# Altium footprint library Cty1.PcbLib: 1378 footprints (part 9 of 87)
Each footprint in its own frame and in the unit in brackets; x right, y up, seen from the top. Pads: shape width x height; smd on the part's side, far side on the other; paste and mask are expansions set on the pad; w line width, h text height; cw(c..) or ccw(c..) is an arc to the next point about the centre after c.
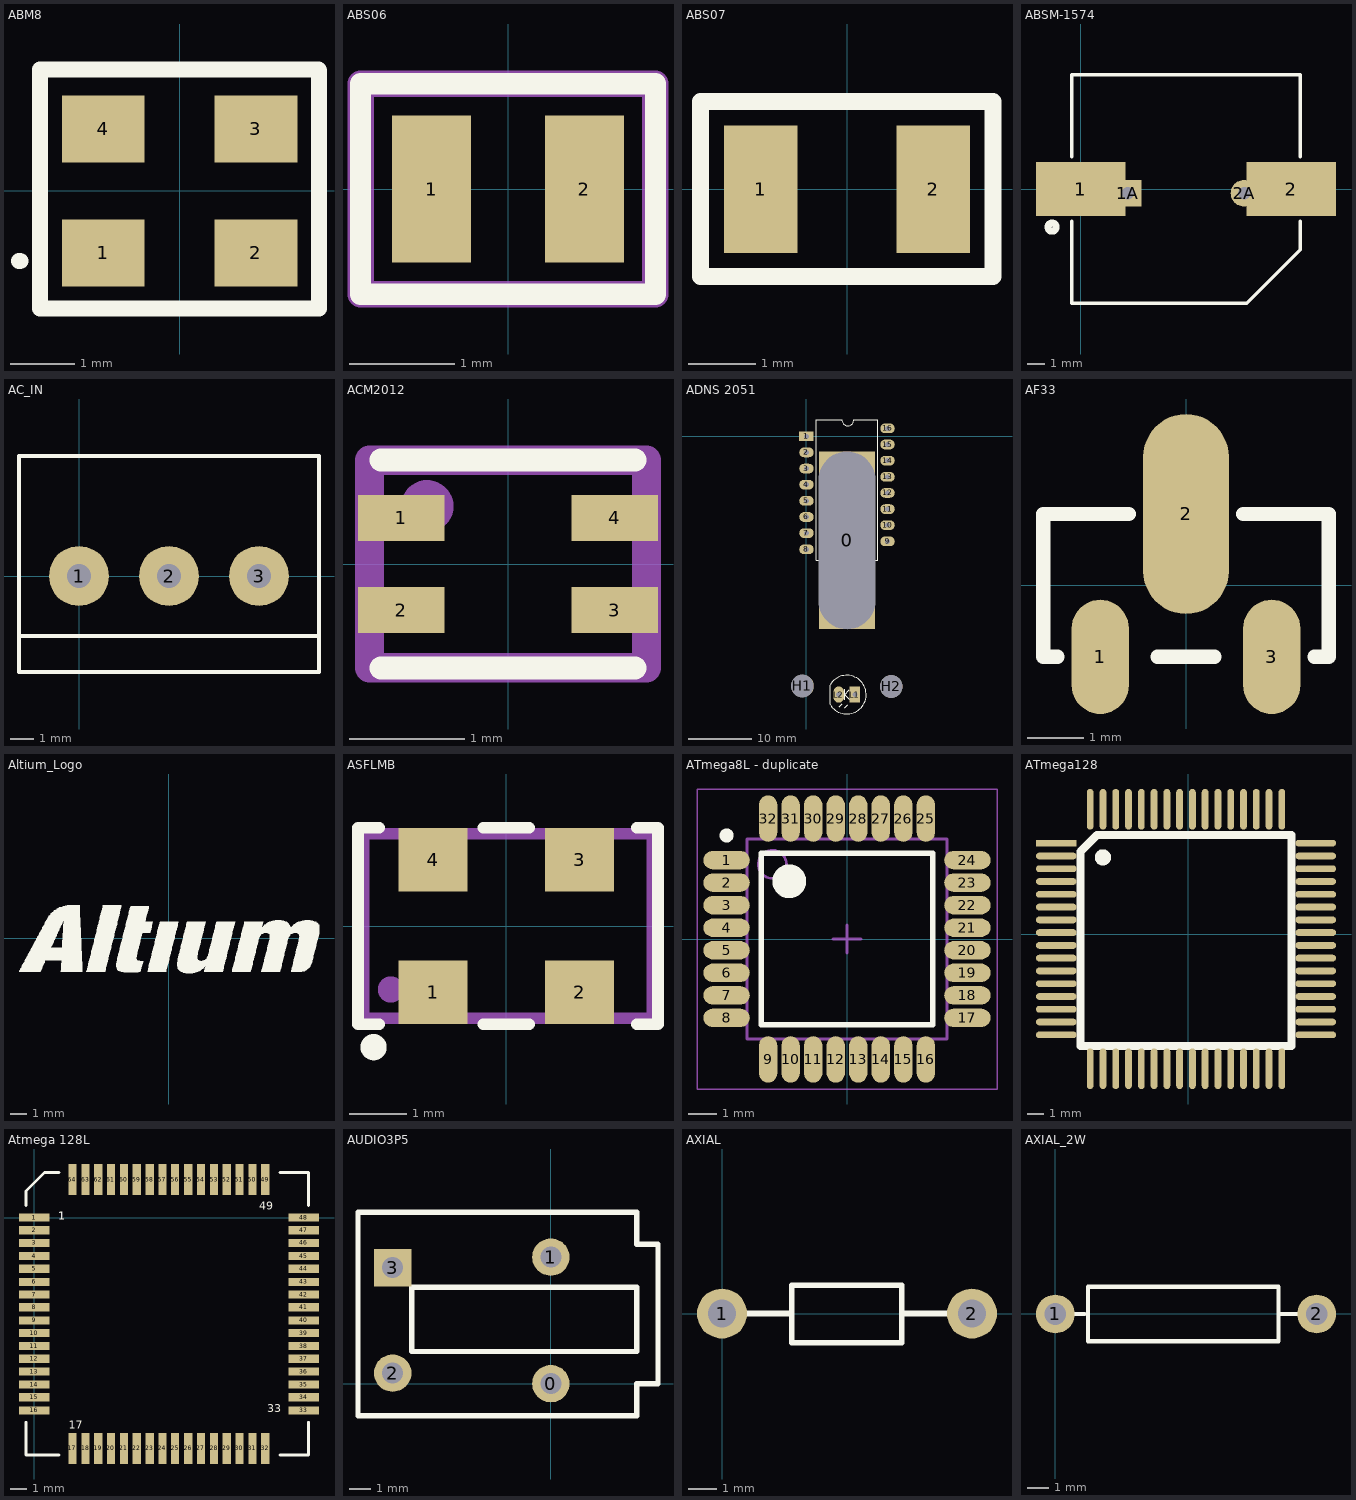
[diagram p8: the footprints below, top view; thin cyan lines are the x and y axes]

## ABM8 [mm] "HC-49US XTAL"
height 4.3
pads (4):
  rect 1.3x1.05 smd: 1(-1.2,-0.97) 2(1.19,-0.97) 3(1.19,0.97) 4(-1.2,0.97)
Top Overlay:
  lines w0.254: -2.52,-1.1 -2.5,-1.1 ; 1.25,1.9 2.17,1.9 2.18,1.89 2.18,-1.84 -2.19,-1.84 -2.19,1.9 2.1,1.9
3D body "ABM8.STEP": height 0.82, standoff 0.02, extent -1.587,-1.346 1.613,1.143

## ABS06 [mm]
pads (2):
  rect 0.75x1.4 smd: 1(-0.725,0) 2(0.725,0)
Top Overlay:
  lines w0.2: -1.4,-1 -1.4,0 -1.4,1 1.4,1 1.4,-1 -1.4,-1
Mechanical 16:
  lines w0.254: -1.4,-1 1.4,-1 1.4,1 -1.4,1 -1.4,-1
Mechanical 29:
  text ".Designator" at -0.5,-0.3 h0.6
3D body "ABS06.STEP": height 0.6, standoff 0, extent -1,-0.62 1,0.6
3D body: height 0.61, standoff 0.5, extent -0.825,-0.36 0.825,0.34

## ABS07 [mm] "HC-49US XTAL"
height 4.3
pads (2):
  rect 1.1x1.9 smd: 1(-1.29,0) 2(1.29,0)
Top Overlay:
  lines w0.254: -2.19,-1.3 2.18,-1.3 2.18,1.31 -2.19,1.31 -2.19,-1.3
3D body "ABS07.STEP": height 0.9, standoff 0.02, extent -1.6,-0.749 1.6,0.749

## ABSM-1574 [mm]
pads (4):
  rect 5x3 smd: 1(0,0) 2(11.8,0)
  rect 1.5x1.5 hole 0.7: 1A(2.65,-0.24)
  round 1.5 hole 0.7: 2A(9.15,-0.24)
Top Overlay:
  circle w0.4: c-1.6,-2.134 r0.227
  lines w0.2: -0.5,-1.8 -0.5,-6.4 9.3,-6.4 12.3,-3.4 12.3,-1.8 ; -0.5,1.8 -0.5,6.4 12.3,6.4 12.3,1.8

## AC_IN [mil] "AC_Input"
height 3
pads (3):
  round 100 hole 40 square: 1(0,0) 2(150,0) 3(300,0)
Top Overlay:
  lines w7: -100,-100 400,-100 ; -100,-160 -100,200 400,200 400,-160 -100,-160

## ACM2012 [mm]
pads (4):
  rect 0.75x0.4 smd mask+0.076: 1(-0.925,0.4) 2(-0.925,-0.4) 3(0.925,-0.4) 4(0.925,0.4)
Top Overlay:
  lines w0.2: -1.1,-0.9 1.1,-0.9 ; -1.1,0.9 1.1,0.9
Mechanical 16:
  circle w0.254: c-0.7,0.5 r0.1
  lines w0.254: -1.2,-0.9 -1.2,0.9 1.2,0.9 1.2,-0.9 -1.2,-0.9
Mechanical 29:
  text ".Designator" at 0.3,0.1 h0.4
3D body: height 1.3, standoff 0, extent -1.2,-0.7 1.2,0.7

## ADNS 2051 [mil] "Foots pin for Mouse"
pads (21):
  rect 350x1100 hole 350 slot 1100 at 90 deg: 0(251,-645)
  rect 90x60 hole 31: 1(0,0)
  oval 90x60 hole 31: 2(0,-100) 3(0,-200) 4(0,-300) 5(0,-400) 6(0,-500) 7(0,-600) 8(0,-700) 9(502,-651) 10(502,-551) 11(502,-451) 12(502,-351) 13(502,-251) 14(502,-151) 15(502,-51) 16(502,49)
  round 140 hole 140: H1(-25,-1547) H2(525,-1550)
  rect 65x100 hole 32: L1(300,-1600.5)
  oval 65x100 hole 32: L2(200,-1600.5)
Top Overlay:
  lines w7: 146,-1660.5 146,-1541.5 ; 146.06,-1540.53 cw(c250,-1600.5) 146.49,-1661.21 ; 204,-1675.5 221,-1658.5 ; 218,103 59,103 59,-767 443,-767 443,103 296,103 ; 218.97,101 ccw(c255.99,101) 293,101 ; 236,-1632.5 236,-1566.5 ; 238,-1681.5 255,-1664.5 ; 265,-1629.5 236,-1600.5 265,-1571.5 ; 394.94,-516.95 ccw(c252.8,-525.96) 395,-518
  text "ADNS2051" at 108,-229 h40

## AF33 [mil]
pads (3):
  oval 40x80 smd: 1(-60,-50) 3(60,-50)
  oval 60x140 smd: 2(0,50)
Top Overlay:
  lines w10: -90,-50 -100,-50 -100,50 -60,50 -40,50 ; -20,-50 20,-50 ; 40,50 100,50 100,-50 90,-50

## Altium_Logo [mm] "Altium Logo"
height 12.3
Top Overlay:
  drawing of 1243 lines, arcs and shapes, not listed

## ASFLMB [mm] "Creator MM"
height 0.9
pads (4):
  rect 1.2x1.1 smd: 1(-1.27,-1.15) 2(1.27,-1.15) 3(1.27,1.15) 4(-1.27,1.15)
Top Overlay:
  circle w0.254: c-2.3,-2.1 r0.1
  lines w0.2: -2.2,-1.7 -2.57,-1.7 -2.57,1.7 -2.2,1.7 ; -0.4,-1.7 0.4,-1.7 ; -0.4,1.7 0.4,1.7 ; 2.26,-1.7 2.63,-1.7 2.63,1.7 2.26,1.7
Mechanical 16:
  circle w0.254: c-2,-1.1 r0.1
  lines w0.2: -2.47,-1.6 2.53,-1.6 2.53,1.6 -2.47,1.6 -2.47,-1.6
Mechanical 29:
  text ".Designator" at 0.3,-0.5 h0.8
3D body: height 0.9, standoff 0, extent -2.47,-1.6 2.53,1.6

## ATmega8L - duplicate [mm] "TQFP, 32-Leads, Body 7.10x7.10mm, Pitch 0.80mm, IPC Medium Density"
height 1.2
pads (32):
  oval 1.65x0.65 smd: 1(-4.275,2.8) 2(-4.275,2) 3(-4.275,1.2) 4(-4.275,0.4) 5(-4.275,-0.4) 6(-4.275,-1.2) 7(-4.275,-2) 8(-4.275,-2.8) 17(4.275,-2.8) 18(4.275,-2) 19(4.275,-1.2) 20(4.275,-0.4) 21(4.275,0.4) 22(4.275,1.2) 23(4.275,2) 24(4.275,2.8)
  oval 0.65x1.65 smd: 9(-2.8,-4.275) 10(-2,-4.275) 11(-1.2,-4.275) 12(-0.4,-4.275) 13(0.4,-4.275) 14(1.2,-4.275) 15(2,-4.275) 16(2.8,-4.275) 25(2.8,4.275) 26(2,4.275) 27(1.2,4.275) 28(0.4,4.275) 29(-0.4,4.275) 30(-1.2,4.275) 31(-2,4.275) 32(-2.8,4.275)
Top Overlay:
  circle w0.25: c-4.275,3.675 r0.125
  circle w0.6: c-2.05,2.05 r0.3
  lines w0.2: -3.05,-3.05 -3.05,3.05 3.05,3.05 3.05,-3.05 -3.05,-3.05
Mechanical 13:
  circle w0.1: c-2.65,2.65 r0.5
  lines w0.1: -3.55,-3.55 -3.55,3.55 3.55,3.55 3.55,-3.55 -3.55,-3.55
Mechanical 15:
  lines w0.05: -5.325,-5.325 -5.325,5.325 5.325,5.325 5.325,-5.325 -5.325,-5.325
  lines w0.1: -0.5,0 0.5,0 ; 0,-0.5 0,0.5
3D body: height 1.2, standoff 0.15, extent -3.55,-3.55 3.55,3.55

## ATmega128 [mm] "Atmega128"
pads (64):
  rect 2.54x0.432 smd: 1(-8.255,5.715)
  oval 2.54x0.432 smd: 2(-8.255,4.915) 3(-8.255,4.115) 4(-8.255,3.315) 5(-8.255,2.515) 6(-8.255,1.715) 7(-8.255,0.915) 8(-8.255,0.115) 9(-8.255,-0.685) 10(-8.255,-1.485) 11(-8.255,-2.285) 12(-8.255,-3.085) 13(-8.255,-3.885) 14(-8.255,-4.685) 15(-8.255,-5.485) 16(-8.255,-6.285) 33(7.995,-6.285) 34(7.995,-5.485) 35(7.995,-4.685) 36(7.995,-3.885) 37(7.995,-3.085) 38(7.995,-2.285) 39(7.995,-1.485) 40(7.995,-0.685) 41(7.995,0.115) 42(7.995,0.915) 43(7.995,1.715) 44(7.995,2.515) 45(7.995,3.315) 46(7.995,4.115) 47(7.995,4.915) 48(7.995,5.715)
  oval 0.432x2.54 smd: 17(-6.13,-8.41) 18(-5.33,-8.41) 19(-4.53,-8.41) 20(-3.73,-8.41) 21(-2.93,-8.41) 22(-2.13,-8.41) 23(-1.33,-8.41) 24(-0.53,-8.41) 25(0.27,-8.41) 26(1.07,-8.41) 27(1.87,-8.41) 28(2.67,-8.41) 29(3.47,-8.41) 30(4.27,-8.41) 31(5.07,-8.41) 32(5.87,-8.41) 49(5.87,7.84) 50(5.07,7.84) 51(4.27,7.84) 52(3.47,7.84) 53(2.67,7.84) 54(1.87,7.84) 55(1.07,7.84) 56(0.27,7.84) 57(-0.53,7.84) 58(-1.33,7.84) 59(-2.13,7.84) 60(-2.93,7.84) 61(-3.73,7.84) 62(-4.53,7.84) 63(-5.33,7.84) 64(-6.13,7.84)
Top Overlay:
  circle w0.508: c-5.334,4.826 r0.254
  lines w0.508: -6.731,-6.985 -6.731,5.207 -5.715,6.223 6.477,6.223 6.477,-6.985 -6.731,-6.985

## Atmega 128L [mil] "Atmega 128L, 64 pin SMT"
height 100
pads (64):
  rect 75x20 smd: 1(0,0) 2(0,-31) 3(0,-62) 4(0,-94) 5(0,-125) 6(0,-157) 7(0,-188) 8(0,-219) 9(0,-251) 10(0,-282) 11(0,-314) 12(0,-345) 13(0,-376) 14(0,-408) 15(0,-439) 16(0,-471) 33(658,-471) 34(658,-439) 35(658,-408) 36(658,-376) 37(658,-345) 38(658,-314) 39(658,-282) 40(658,-251) 41(658,-219) 42(658,-188) 43(658,-157) 44(658,-125) 45(658,-94) 46(658,-62) 47(658,-31) 48(658,0)
  rect 20x75 smd: 17(93,-564) 18(125,-564) 19(156,-564) 20(187,-564) 21(219,-564) 22(250,-564) 23(282,-564) 24(313,-564) 25(344,-564) 26(376,-564) 27(407,-564) 28(439,-564) 29(470,-564) 30(501,-564) 31(533,-564) 32(564,-564) 49(564,93) 50(533,93) 51(501,93) 52(470,93) 53(439,93) 54(407,93) 55(376,93) 56(344,93) 57(313,93) 58(282,93) 59(250,93) 60(219,93) 61(187,93) 62(156,93) 63(125,93) 64(93,93)
Top Overlay:
  lines w7: -20,-500 -20,-580 60,-580 ; -20,30 -20,65 25,110 60,110 ; 600,-580 670,-580 670,-500 ; 600,110 670,110 670,30
  text "1" at 59,-5.5 h20
  text "1" at 59,-5.5 h20
  text "49" at 549,19.5 h20
  text "17" at 84,-515.5 h20
  text "33" at 569,-475.5 h20

## AUDIO3P5 [mm]
pads (4):
  round 1.778 hole 1 unplated: 0(0,0) 1(0,6) 2(-7.5,0.5)
  rect 1.778x1.778 hole 1 unplated: 3(-7.5,5.5)
Top Overlay:
  lines w0.254: -9.144,-1.524 4.064,-1.524 4.064,0 5.08,0 5.08,6.604 4.064,6.604 4.064,8.128 1.524,8.128 -9.144,8.128 -9.144,-1.524 ; -6.604,1.524 4.064,1.524 4.064,4.572 -6.604,4.572 -6.604,1.524

## AXIAL [mil]
pads (2):
  round 70 hole 39.37 unplated: 1(0,0) 2(350,0)
Top Overlay:
  lines w7.87: 35,0 93,0 ; 97.57,-40.63 251.57,-40.63 ; 97.57,-39.37 97.57,39.37 251.57,39.37 251.57,0 ; 251.57,-40 251.57,-0.63 ; 255,0 313,0

## AXIAL_2W [mil]
pads (2):
  round 70 hole 39.37 unplated: 1(0,0) 2(472.44,0)
Top Overlay:
  lines w7.87: 14,0 52.57,0 ; 413.39,0 452.76,0 ; 435.88,0 403.54,0 ; 403.54,0 403.54,-49.21 59.06,-49.21 59.06,49.21 403.54,49.21 403.54,0